# Altium integrated library Connector.IntLib: 26 symbols
Pins are listed as number, name and electrical type; pins without a type are passive.

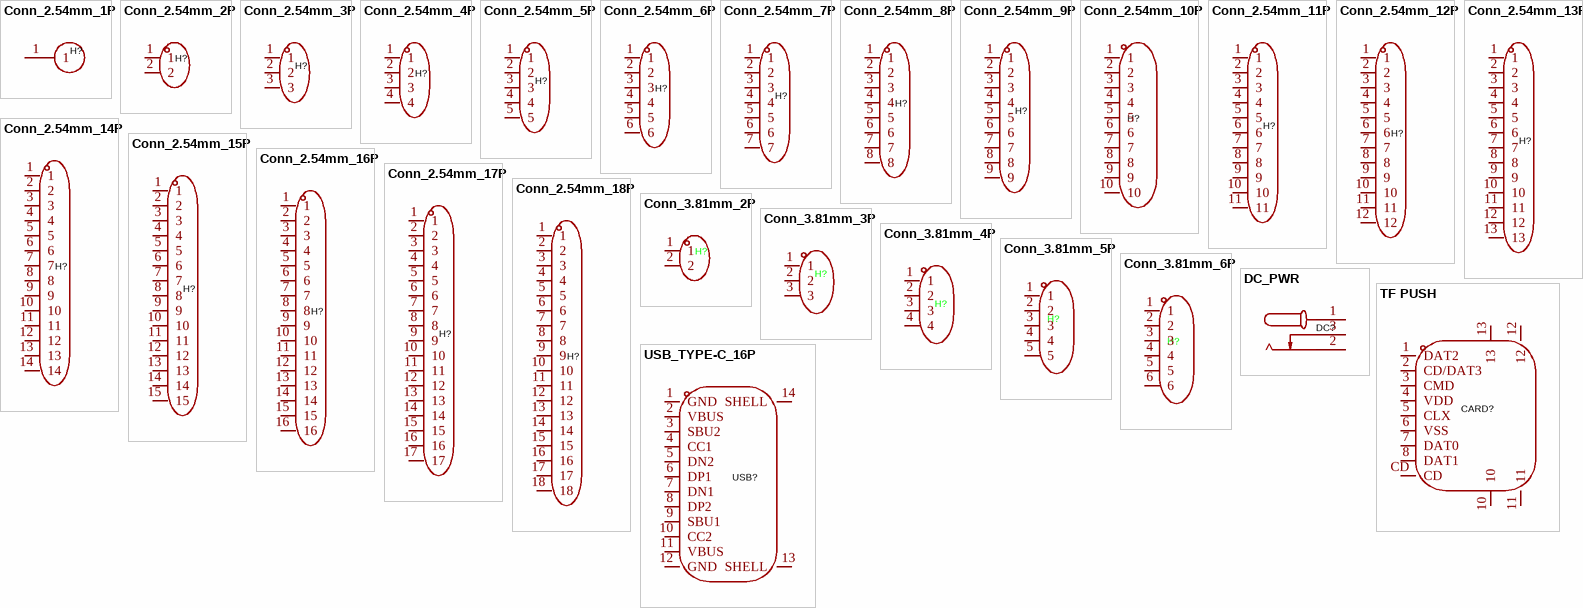
[diagram p0: symbols Conn_2.54mm_1P to USB_TYPE-C_16P]

## Conn_2.54mm_1P
designator H?
footprint HDR-TH_1P-P2.54-V-M
pins: 1

## Conn_2.54mm_2P
designator H?
footprint HDR-TH_2P-P2.54-V-M
pins: 1, 2

## Conn_2.54mm_3P
designator H?
footprint HDR-TH_3P-P2.54-V-M
pins: 1, 2, 3

## Conn_2.54mm_4P
designator H?
footprint HDR-TH_4P-P2.54-V-M
pins: 1, 2, 3, 4

## Conn_2.54mm_5P
designator H?
footprint HDR-TH_5P-P2.54-V-M
pins: 1, 2, 3, 4, 5

## Conn_2.54mm_6P
designator H?
footprint HDR-TH_6P-P2.54-V-M
pins: 1, 2, 3, 4, 5, 6

## Conn_2.54mm_7P
designator H?
footprint HDR-TH_7P-P2.54-V-M
pins: 1, 2, 3, 4, 5, 6, 7

## Conn_2.54mm_8P
designator H?
footprint HDR-TH_8P-P2.54-V-M
pins: 1, 2, 3, 4, 5, 6, 7, 8

## Conn_2.54mm_9P
designator H?
footprint HDR-TH_9P-P2.54-V-M
pins: 1, 2, 3, 4, 5, 6, 7, 8, 9

## Conn_2.54mm_10P
designator H?
footprint HDR-TH_10P-P2.54-V-M-1
pins: 1, 2, 3, 4, 5, 6, 7, 8, 9, 10

## Conn_2.54mm_11P
designator H?
footprint HDR-TH_11P-P2.54-V-M
pins: 1, 2, 3, 4, 5, 6, 7, 8, 9, 10, 11

## Conn_2.54mm_12P
designator H?
footprint HDR-TH_12P-P2.54-V-M
pins: 1, 2, 3, 4, 5, 6, 7, 8, 9, 10, 11, 12

## Conn_2.54mm_13P
designator H?
footprint HDR-TH_13P-P2.54-V-M
pins: 1, 2, 3, 4, 5, 6, 7, 8, 9, 10, 11, 12, 13

## Conn_2.54mm_14P
designator H?
footprint HDR-TH_14P-P2.54-V-M
pins: 1, 2, 3, 4, 5, 6, 7, 8, 9, 10, 11, 12, 13, 14

## Conn_2.54mm_15P
designator H?
footprint HDR-TH_15P-P2.54-V-M
pins: 1, 2, 3, 4, 5, 6, 7, 8, 9, 10, 11, 12, 13, 14, 15

## Conn_2.54mm_16P
designator H?
footprint HDR-TH_16P-P2.54-V-M-2
pins: 1, 2, 3, 4, 5, 6, 7, 8, 9, 10, 11, 12, 13, 14, 15, 16

## Conn_2.54mm_17P
designator H?
footprint HDR-TH_17P-P2.54-V-M
pins: 1, 2, 3, 4, 5, 6, 7, 8, 9, 10, 11, 12, 13, 14, 15, 16, 17

## Conn_2.54mm_18P
designator H?
footprint HDR-TH_18P-P2.54-V-M
pins: 1, 2, 3, 4, 5, 6, 7, 8, 9, 10, 11, 12, 13, 14, 15, 16, 17, 18

## Conn_3.81mm_2P
designator H?
footprint CONN_2P_P3.81_VERTICAL (3.81mm 2P 直插)
footprint CONN_2P_P3.81_HORIZONTAL (3.81mm 2P 弯插)
pins: 1, 2

## Conn_3.81mm_3P
designator H?
footprint CONN_3P_P3.81_VERTICAL (3.81mm 3P 直插)
footprint CONN_3P_P3.81_HORIZONTAL (3.81mm 3P 弯插)
pins: 1, 2, 3

## Conn_3.81mm_4P
designator H?
footprint CONN_4P_P3.81_VERTICAL (3.81mm 4P 直插)
footprint CONN_4P_P3.81_HORIZONTAL (3.81mm 4P 弯插)
pins: 1, 2, 3, 4

## Conn_3.81mm_5P
designator H?
footprint CONN_5P_P3.81_VERTICAL (3.81mm 5P 直插)
footprint CONN_6P_P3.81_HORIZONTAL (3.81mm 6P 弯插)
pins: 1, 2, 3, 4, 5

## Conn_3.81mm_6P
designator H?
footprint CONN_6P_P3.81_VERTICAL (3.81mm 6P 直插)
footprint CONN_6P_P3.81_HORIZONTAL (3.81mm 6P 弯插)
pins: 1, 2, 3, 4, 5, 6

## DC_PWR
designator DC?
footprint DC-IN-TH_DC-005-A200
pins: 1, 2, 3

## TF PUSH
designator CARD?
footprint TF-SMD_TF-PUSH
pins: 1 DAT2, 2 CD/DAT3, 3 CMD, 4 VDD, 5 CLX, 6 VSS, 7 DAT0, 8 DAT1, 10, 11, 12, 13, CD

## USB_TYPE-C_16P
designator USB?
footprint USB-C-SMD_TYPE-C-6PIN-2MD-073
pins: 1 GND, 2 VBUS, 3 SBU2, 4 CC1, 5 DN2, 6 DP1, 7 DN1, 8 DP2, 9 SBU1, 10 CC2, 11 VBUS, 12 GND, 13 SHELL, 14 SHELL